# Altium integrated library Res-THP_V2.IntLib: 460 symbols (part 1 of 3) (continued)
## 2R2-1W_KNP100_5%
designator R?, comment value 2R2  Watt: 1W  (hidden comment: KNP100JR-52-2R2)
Resistor Wirewound; Manufacturer: Yageo; Tol: 5%; Part Number: KNP100JR-52-2R2; Package: RES-KNP100; EDM-PN: *; Text2: *; Text1: *
footprint RES-KNP100 (RES 1W PMW 11.5x4.5mm)
pins: 1, 2

## 2R2-1W_KNP100_5%-LARGE
designator R?, comment value 2R2  Watt: 1W  (hidden comment: KNP100JR-52-2R2)
Resistor Wirewound; Manufacturer: Yageo; Tol: 5%; Part Number: KNP100JR-52-2R2; Package: RES-KNP100-LARGE; EDM-PN: *; Text2: *; Text1: *
footprint RES-KNP100-LARGE (RES 1W PMW 11.5x4.5mm)
pins: 1, 2

## 2R2-5W-5%-SQP500
designator R?  value 2R2  Watt: 5W  (hidden comment: 2R2-5W-5%-SQP500)
Resistor Cement; Manufacturer: Yageo; Part Number: SQP500JB-2R2; Tol: 5%; Reutech PN: 5905-WW-0129; Package: RES-SQP500; EDM-PN: *; Text2: *; Text1: *
footprint RES-SQP500 (SQP500  22.0x9.5mm)
pins: 1, 2

## 3K3-0.250W-1%
designator R?, comment value 3K3  Watt: 0.25W  (hidden comment: 3K3-0.250W-1%_H)
Resistor Metal Film; Manufacturer: Various; Part Number: 3K3 1% 0.25W; Tol: 1%; Package: RES-0.250W; EDM-PN: *; Text2: *; Text1: *
footprint RES-0.250W (Res 0.25W 7.6x2.3mm)
pins: 1, 2

## 3K3-0.250W-1%-LARGE
designator R?, comment value 3K3  Watt: 0.25W  (hidden comment: 3K3-0.250W-1%_H)
Resistor Metal Film; Manufacturer: Various; Part Number: 3K3 1% 0.25W; Tol: 1%; Package: RES-0.250W-LARGE; EDM-PN: *; Text2: *; Text1: *
footprint RES-0.250W-LARGE (Res 0.25W 7.6x2.3mm)
pins: 1, 2

## 3K3-0.250W-2%-MOF
designator R?, comment value 3K3  Watt: 0.25W  (hidden comment: 3K3-0.250W-2%)
Resistor Metal Oxide Film; Manufacturer: Various; Part Number: 3K3 2% 0.25W MOF; Tol: 2%; Package: RES-0.250W; EDM-PN: *; Text2: *; Text1: *
footprint RES-0.250W (Res 0.25W 7.6x2.3mm)
pins: 1, 2

## 3K3-0.250W-2%-MOF-500
designator R?, comment value 3K3  Watt: 0.25W  (hidden comment: 3K3-0.250W-2%)
Resistor Metal Oxide Film; Manufacturer: Various; Part Number: 3K3 2% 0.25W MOF; Tol: 2%; Package: RES-0.250W-500; EDM-PN: *; Text2: *; Text1: *
footprint RES-0.250W-500 (Res 0.25W 7.6x2.3mm)
pins: 1, 2

## 3K3-1W-PR01-5%
designator R?  value 3K3  Watt: 1W  (hidden comment: 3K3-1W-PR01-5%)
Resistor Power Metal Film; Manufacturer: Various; Part Number: 3K3 5% 1W; Tol: 5%; Package: RES-PR01; EDM-PN: *; Text2: *; Text1: *
footprint RES-PR01 (RES-PR01 6.5x2.5mm)
pins: 1, 2

## 3K9-0.250W-1%
designator R?, comment value 3K9  Watt: 0.25W  (hidden comment: 3K9-0.250W-1%_H)
Resistor Metal Film; Manufacturer: Various; Part Number: 3K9 1% 0.25W; Tol: 1%; Package: RES-0.250W; EDM-PN: *; Text2: *; Text1: *
footprint RES-0.250W (Res 0.25W 7.6x2.3mm)
pins: 1, 2

## 3K9-0.250W-5%
designator R?, comment value 3K9  Watt: 0.25W  (hidden comment: 3K9-0.250W-5%_H)
Resistor Carbon; Manufacturer: Various; Part Number: 3K9 5% 0.25W; Tol: 5%; Package: RES-0.250W; EDM-PN: *; Text2: *; Text1: *
footprint RES-0.250W (Res 0.25W 7.6x2.3mm)
pins: 1, 2

## 3K-0.250W-1%
designator R?, comment value 3K  Watt: 0.25W  (hidden comment: 3K-0.250W-1%_H)
Resistor Metal Film; Manufacturer: Various; Part Number: 3K 1% 0.25W; Tol: 1%; Package: RES-0.250W; EDM-PN: *; Text2: *; Text1: *
footprint RES-0.250W (Res 0.25W 7.6x2.3mm)
pins: 1, 2

## 3R3-AC05-WW
designator R?  value 3R3  Watt: 5W  (hidden comment: 3R3-AC05-WW)
Resistor Wirewound; Manufacturer: Various; Part Number: 3R3 5% AC05; Tol: 5%; Package: RES-AC05; EDM-PN: *; Text2: *; Text1: *
footprint Res-AC05 (Res AC05 18.0x10.0mm)
pins: 1, 2

## 3R9_1W_KNP100_1%
designator R?, comment value 3R9  Watt: 1W  (hidden comment: 3R9_1W_KNP100_1%_H)
Resistor Wirewound; Manufacturer: Yageo; Part Number: KNP100FB-3R9; Tol: 1%; Package: RES-KNP100; EDM-PN: *; Text2: *; Text1: *
footprint RES-KNP100 (RES 1W PMW 11.5x4.5mm)
pins: 1, 2

## 3R9_1W_KNP100_1%-DNF
designator R?, comment value (3R9)  Watt: 1W  (hidden comment: 3R9_1W_KNP100_1%_H-DNF)
Resistor Wirewound - Do not Fit; Manufacturer: Yageo; Part Number: DNF - KNP100FB-3R9; Tol: 1%; Package: RES-KNP100; EDM-PN: *; Text2: *; Text1: *
footprint RES-KNP100 (RES 1W PMW 11.5x4.5mm)
pins: 1, 2

## 3R9_1W_KNP100_5%
designator R?, comment value 3R9  Watt: 1W  (hidden comment: 3R9_1W_KNP100_5%_H)
Resistor Wirewound; Manufacturer: Yageo; Part Number: KNP100JB-3R9; Tol: 5%; Package: RES-KNP100; EDM-PN: *; Text2: *; Text1: *
footprint RES-KNP100 (RES 1W PMW 11.5x4.5mm)
pins: 1, 2

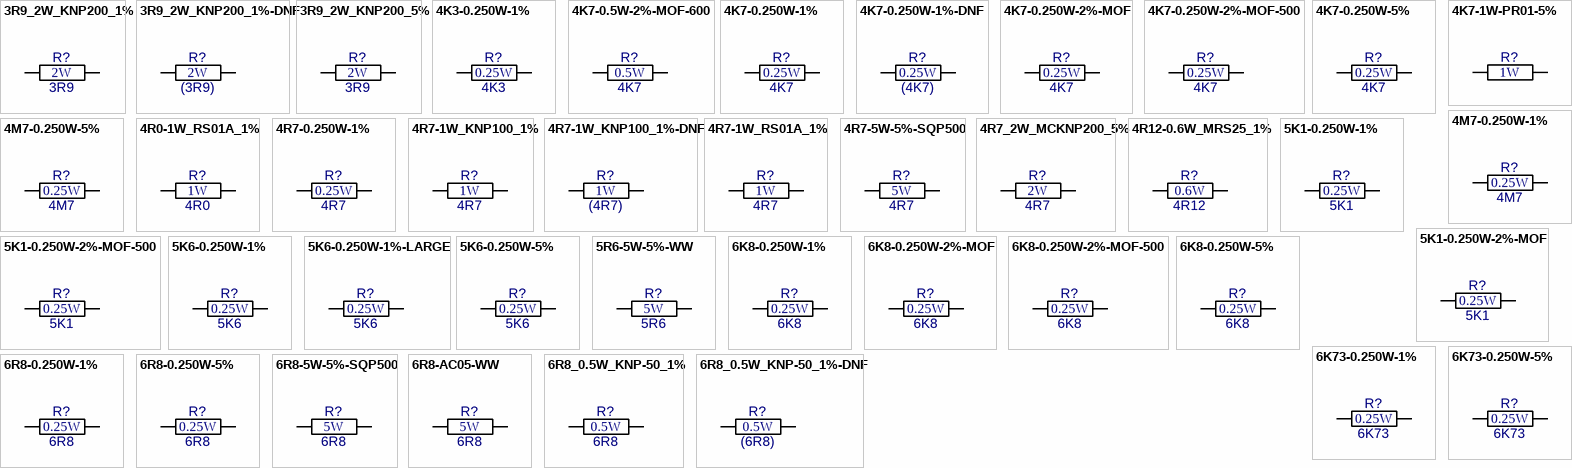
[diagram p3: symbols 3R9_2W_KNP200_1% to 6R8_0.5W_KNP-50_1%-DNF]

## 3R9_2W_KNP200_1%
designator R?, comment value 3R9  Watt: 2W  (hidden comment: 3R9_2W_KNP200_1%_H)
Resistor Wirewound; Manufacturer: Yageo; Part Number: KNP200FB-3R9; Tol: 1%; Package: RES-KNP200; EDM-PN: *; Text2: *; Text1: *
footprint RES-KNP200 (Res KNP200 15.5x5.5mm)
pins: 1, 2

## 3R9_2W_KNP200_1%-DNF
designator R?, comment value (3R9)  Watt: 2W  (hidden comment: 3R9_2W_KNP200_1%_H-DNF)
Resistor Wirewound - Do not Fit; Manufacturer: Yageo; Part Number: DNF - KNP200FB-3R9; Tol: 1%; Package: RES-KNP200; EDM-PN: *; Text2: *; Text1: *
footprint RES-KNP200 (Res KNP200 15.5x5.5mm)
pins: 1, 2

## 3R9_2W_KNP200_5%
designator R?, comment value 3R9  Watt: 2W  (hidden comment: 3R9_2W_KNP200_5%_H)
Resistor Wirewound; Manufacturer: Yageo; Part Number: KNP200JB-3R9; Tol: 5%; Package: RES-KNP200; EDM-PN: *; Text2: *; Text1: *
footprint RES-KNP200 (Res KNP200 15.5x5.5mm)
pins: 1, 2

## 4K3-0.250W-1%
designator R?  value 4K3  Watt: 0.25W  (hidden comment: 4K3-0.250W-1%)
Resistor Metal Film; Manufacturer: Various; Part Number: 4K3 1% 0.25W; Tol: 1%; Package: RES-0.250W; EDM-PN: *; Text2: *; Text1: *
footprint RES-0.250W (Res 0.25W 7.6x2.3mm)
pins: 1, 2

## 4K7-0.5W-2%-MOF-600
designator R?, comment value 4K7  Watt: 0.5W  (hidden comment: 4K7-0.5W-2%)
Resistor Metal Oxide Film; Manufacturer: Various; Part Number: 4K7 2% 0.5W MOF; Tol: 2%; Package: RES-0.5W-600; EDM-PN: *; Text2: *; Text1: *
footprint RES-0.5W-600 (RES-0.5W 10.0x3.8mm)
pins: 1, 2

## 4K7-0.250W-1%
designator R?, comment value 4K7  Watt: 0.25W  (hidden comment: 4K7-0.250W-1%_H)
Resistor Metal Film; Manufacturer: Various; Part Number: 4K7 1% 0.25W; Tol: 1%; Package: RES-0.250W; EDM-PN: *; Text2: *; Text1: *
footprint RES-0.250W (Res 0.25W 7.6x2.3mm)
pins: 1, 2

## 4K7-0.250W-1%-DNF
designator R?, comment value (4K7)  Watt: 0.25W  (hidden comment: 4K7-0.250W-1%_H-DNF)
Resistor Metal Film - Do not Fit; Manufacturer: Various; Part Number: DNF - 4K7 1% 0.25W; Tol: 1%; Package: RES-0.250W; EDM-PN: *; Text2: *; Text1: *
footprint RES-0.250W (Res 0.25W 7.6x2.3mm)
pins: 1, 2

## 4K7-0.250W-2%-MOF
designator R?, comment value 4K7  Watt: 0.25W  (hidden comment: 4K7-0.250W-2%)
Resistor Metal Oxide Film; Manufacturer: Various; Part Number: 4K7 2% 0.25W MOF; Tol: 2%; Package: RES-0.250W; EDM-PN: *; Text2: *; Text1: *
footprint RES-0.250W (Res 0.25W 7.6x2.3mm)
pins: 1, 2

## 4K7-0.250W-2%-MOF-500
designator R?, comment value 4K7  Watt: 0.25W  (hidden comment: 4K7-0.250W-2%)
Resistor Metal Oxide Film; Manufacturer: Various; Part Number: 4K7 2% 0.25W MOF; Tol: 2%; Package: RES-0.250W-500; EDM-PN: *; Text2: *; Text1: *
footprint RES-0.250W-500 (Res 0.25W 7.6x2.3mm)
pins: 1, 2

## 4K7-0.250W-5%
designator R?, comment value 4K7  Watt: 0.25W  (hidden comment: 4K7-0.250W-5%_H)
Resistor Carbon; Manufacturer: Various; Part Number: 4K7 5% 0.25W; Tol: 5%; Package: RES-0.250W; EDM-PN: *; Text2: *; Text1: *
footprint RES-0.250W (Res 0.25W 7.6x2.3mm)
pins: 1, 2

## 4K7-1W-PR01-5%
designator R?  Watt: 1W  (hidden comment: 4K7-1W-PR01-5%)
Resistor Power Metal Film; Manufacturer: Various; Part Number: 4K7 5% 1W; Tol: 5%; Value: 4K7; Package: RES-PR01; EDM-PN: *; Text2: *; Text1: *
footprint RES-PR01 (RES-PR01 6.5x2.5mm)
pins: 1, 2

## 4M7-0.250W-1%
designator R?, comment value 4M7  Watt: 0.25W  (hidden comment: 4M7-0.250W-1%_H)
Resistor Metal Film; Manufacturer: Various; Part Number: 4M7 1% 0.25W; Tol: 1%; Package: RES-0.250W; EDM-PN: *; Text2: *; Text1: *
footprint RES-0.250W (Res 0.25W 7.6x2.3mm)
pins: 1, 2

## 4M7-0.250W-5%
designator R?, comment value 4M7  Watt: 0.25W  (hidden comment: 4M7-0.250W-5%_H)
Resistor Carbon; Manufacturer: Various; Part Number: 4M7 5% 0.25W; Tol: 5%; Package: RES-0.250W; EDM-PN: *; Text2: *; Text1: *
footprint RES-0.250W (Res 0.25W 7.6x2.3mm)
pins: 1, 2

## 4R0-1W_RS01A_1%
designator R?, comment value 4R0  Watt: 1W  (hidden comment: RS01A4R000FE12)
Resistor Wirewound; Manufacturer: Vishay; Tol: 1%; Part Number: RS01A4R000FE12; Package: RES-RS01A; EDM-PN: *; Text2: *; Text1: *
footprint RES-RS01A (RS01A 10.31x2.39mm)
pins: 1, 2

## 4R7-0.250W-1%
designator R?, comment value 4R7  Watt: 0.25W  (hidden comment: 4R7-0.250W-1%_H)
Resistor Metal Film; Manufacturer: Various; Part Number: 4R7 1% 0.25W; Tol: 1%; Package: RES-0.250W; EDM-PN: *; Text2: *; Text1: *
footprint RES-0.250W (Res 0.25W 7.6x2.3mm)
pins: 1, 2

## 4R7-1W_KNP100_1%
designator R?, comment value 4R7  Watt: 1W  (hidden comment: 4R7_1W_KNP100_1%_H)
Resistor Wirewound; Manufacturer: Yageo; Part Number: KNP100FB-4R7; Tol: 1%; Package: RES-KNP100; EDM-PN: *; Text2: *; Text1: *
footprint RES-KNP100 (RES 1W PMW 11.5x4.5mm)
pins: 1, 2

## 4R7-1W_KNP100_1%-DNF
designator R?, comment value (4R7)  Watt: 1W  (hidden comment: 4R7_1W_KNP100_1%_H-DNF)
Resistor Wirewound - Do not Fit; Manufacturer: Yageo; Part Number: DNF - KNP100FB-4R7; Tol: 1%; Package: RES-KNP100; EDM-PN: *; Text2: *; Text1: *
footprint RES-KNP100 (RES 1W PMW 11.5x4.5mm)
pins: 1, 2

## 4R7-1W_RS01A_1%
designator R?, comment value 4R7  Watt: 1W  (hidden comment: RS01A4R700FB12)
Resistor Wirewound; Manufacturer: Vishay; Tol: 1%; Part Number: RS01A4R700FB12; Package: RES-RS01A; EDM-PN: *; Text2: *; Text1: *
footprint RES-RS01A (RS01A 10.31x2.39mm)
pins: 1, 2

## 4R7-5W-5%-SQP500
designator R?  value 4R7  Watt: 5W  (hidden comment: 4R7-5W-5%-SQP500)
Resistor Cement; Manufacturer: Yageo; Part Number: SQP500JB-4R7; Tol: 5%; Package: RES-SQP500; EDM-PN: *; Text2: *; Text1: *
footprint RES-SQP500 (SQP500  22.0x9.5mm)
pins: 1, 2

## 4R7_2W_MCKNP200_5%
designator R?, comment value 4R7  Watt: 2W  (hidden comment: 4R7_2W_MCKNP200_5%_H)
Resistor Wirewound; Manufacturer: Multicomp; Part Number: MCKNP02SJ047JA10; Tol: 2%; Package: RES-MCKNP200; EDM-PN: *; Text2: *; Text1: *
footprint Res-MCKNP200 (Res MCKNP200 16.0x5.5mm)
pins: 1, 2

## 4R12-0.6W_MRS25_1%
designator R?, comment value 4R12  Watt: 0.6W  (hidden comment: MRS25000C4128FCT00)
Resistor Metal Film; Manufacturer: Vishay; Tol: 1%; Part Number: MRS25000C4128FCT00; Package: RES-MRS25; EDM-PN: *; Text2: *; Text1: *
footprint RES-MRS25 (MRS25 6.5x2.5mm)
pins: 1, 2

## 5K1-0.250W-1%
designator R?  value 5K1  Watt: 0.25W  (hidden comment: 5K1-0.250W-1%)
Resistor Metal Film; Manufacturer: Various; Part Number: 5K1 1% 0.25W; Tol: 1%; Package: RES-0.250W; EDM-PN: *; Text2: *; Text1: *
footprint RES-0.250W (Res 0.25W 7.6x2.3mm)
pins: 1, 2

## 5K1-0.250W-2%-MOF
designator R?, comment value 5K1  Watt: 0.25W  (hidden comment: 5K1-0.250W-2%)
Resistor Metal Oxide Film; Manufacturer: Various; Part Number: 5K1 2% 0.25W MOF; Tol: 2%; Package: RES-0.250W; EDM-PN: *; Text2: *; Text1: *
footprint RES-0.250W (Res 0.25W 7.6x2.3mm)
pins: 1, 2

## 5K1-0.250W-2%-MOF-500
designator R?, comment value 5K1  Watt: 0.25W  (hidden comment: 5K1-0.250W-2%)
Resistor Metal Oxide Film; Manufacturer: Various; Part Number: 5K1 2% 0.25W MOF; Tol: 2%; Package: RES-0.250W-500; EDM-PN: *; Text2: *; Text1: *
footprint RES-0.250W-500 (Res 0.25W 7.6x2.3mm)
pins: 1, 2

## 5K6-0.250W-1%
designator R?, comment value 5K6  Watt: 0.25W  (hidden comment: 5K6-0.250W-1%_H)
Resistor Metal Film; Manufacturer: Various; Part Number: 5K6 1% 0.25W; Tol: 1%; Package: RES-0.250W; EDM-PN: *; Text2: *; Text1: *
footprint RES-0.250W (Res 0.25W 7.6x2.3mm)
pins: 1, 2

## 5K6-0.250W-1%-LARGE
designator R?, comment value 5K6  Watt: 0.25W  (hidden comment: 5K6-0.250W-1%_H)
Resistor Metal Film; Manufacturer: Various; Part Number: 5K6 1% 0.25W; Tol: 1%; Package: RES-0.250W-LARGE; EDM-PN: *; Text2: *; Text1: *
footprint RES-0.250W-LARGE (Res 0.25W 7.6x2.3mm)
pins: 1, 2

## 5K6-0.250W-5%
designator R?, comment value 5K6  Watt: 0.25W  (hidden comment: 5K6-0.250W-5%_H)
Resistor Carbon; Manufacturer: Various; Part Number: 5K6 5% 0.25W; Tol: 5%; Package: RES-0.250W; EDM-PN: *; Text2: *; Text1: *
footprint RES-0.250W (Res 0.25W 7.6x2.3mm)
pins: 1, 2

## 5R6-5W-5%-WW
designator R?  value 5R6  Watt: 5W  (hidden comment: 5R6-5W-5%-WW)
Resistor Wirewound; Manufacturer: Various; Part Number: 5R6 5% 5W WW; Tol: 5%; Package: RES-5W-WW; EDM-PN: *; Text2: *; Text1: *
footprint Res-5W-WW (Res 5W WW 17.0x7.5mm)
pins: 1, 2

## 6K8-0.250W-1%
designator R?, comment value 6K8  Watt: 0.25W  (hidden comment: 6K8-0.250W-1%_H)
Resistor Metal Film; Manufacturer: Various; Part Number: 6K8 1% 0.25W; Tol: 1%; Package: RES-0.250W; EDM-PN: *; Text2: *; Text1: *
footprint RES-0.250W (Res 0.25W 7.6x2.3mm)
pins: 1, 2

## 6K8-0.250W-2%-MOF
designator R?, comment value 6K8  Watt: 0.25W  (hidden comment: 6K8-0.250W-2%)
Resistor Metal Oxide Film; Manufacturer: Various; Part Number: 6K8 2% 0.25W MOF; Tol: 2%; Package: RES-0.250W; EDM-PN: *; Text2: *; Text1: *
footprint RES-0.250W (Res 0.25W 7.6x2.3mm)
pins: 1, 2

## 6K8-0.250W-2%-MOF-500
designator R?, comment value 6K8  Watt: 0.25W  (hidden comment: 6K8-0.250W-2%)
Resistor Metal Oxide Film; Manufacturer: Various; Part Number: 6K8 2% 0.25W MOF; Tol: 2%; Package: RES-0.250W-500; EDM-PN: *; Text2: *; Text1: *
footprint RES-0.250W-500 (Res 0.25W 7.6x2.3mm)
pins: 1, 2

## 6K8-0.250W-5%
designator R?, comment value 6K8  Watt: 0.25W  (hidden comment: 6K8-0.250W-5%_H)
Resistor Carbon; Manufacturer: Various; Part Number: 6K8 5% 0.25W; Tol: 5%; Package: RES-0.250W; EDM-PN: *; Text2: *; Text1: *
footprint RES-0.250W (Res 0.25W 7.6x2.3mm)
pins: 1, 2

## 6K73-0.250W-1%
designator R?, comment value 6K73  Watt: 0.25W  (hidden comment: 6K73-0.250W-1%_H)
Resistor Metal Film; Manufacturer: Various; Part Number: 6K73 1% 0.25W; Tol: 1%; Package: RES-0.250W; EDM-PN: *; Text2: *; Text1: *
footprint RES-0.250W (Res 0.25W 7.6x2.3mm)
pins: 1, 2

## 6K73-0.250W-5%
designator R?, comment value 6K73  Watt: 0.25W  (hidden comment: 6K73-0.250W-5%_H)
Resistor Carbon; Manufacturer: Various; Part Number: 6K73 5% 0.25W; Tol: 5%; Package: RES-0.250W; EDM-PN: *; Text2: *; Text1: *
footprint RES-0.250W (Res 0.25W 7.6x2.3mm)
pins: 1, 2

## 6R8-0.250W-1%
designator R?, comment value 6R8  Watt: 0.25W  (hidden comment: 6R8-0.250W-1%_H)
Resistor Metal Film; Manufacturer: Various; Part Number: 6R8 1% 0.25W; Tol: 1%; Package: RES-0.250W; EDM-PN: *; Text2: *; Text1: *
footprint RES-0.250W (Res 0.25W 7.6x2.3mm)
pins: 1, 2

## 6R8-0.250W-5%
designator R?, comment value 6R8  Watt: 0.25W  (hidden comment: 6R8-0.250W-5%_H)
Resistor Carbon; Manufacturer: Various; Part Number: 6R8 5% 0.25W; Tol: 5%; Package: RES-0.250W; EDM-PN: *; Text2: *; Text1: *
footprint RES-0.250W (Res 0.25W 7.6x2.3mm)
pins: 1, 2

## 6R8-5W-5%-SQP500
designator R?  value 6R8  Watt: 5W  (hidden comment: 6R8-5W-5%-SQP500)
Resistor Cement; Manufacturer: Yageo; Part Number: SQP500JB-6R8; Tol: 5%; Package: RES-SQP500; EDM-PN: *; Text2: *; Text1: *
footprint RES-SQP500 (SQP500  22.0x9.5mm)
pins: 1, 2

## 6R8-AC05-WW
designator R?  value 6R8  Watt: 5W  (hidden comment: 6R8-AC05-WW)
Resistor Wirewound; Manufacturer: Various; Part Number: 6R8 5% AC05; Tol: 5%; Package: RES-AC05; EDM-PN: *; Text2: *; Text1: *
footprint Res-AC05 (Res AC05 18.0x10.0mm)
pins: 1, 2

## 6R8_0.5W_KNP-50_1%
designator R?, comment value 6R8  Watt: 0.5W  (hidden comment: 6R8_0.5W_KNP-50_1%_H)
Resistor Wirewound; Manufacturer: Yageo; Part Number: KNP-50FB-6R8; Tol: 1%; Package: RES-KNP-50; EDM-PN: *; Text2: *; Text1: *
footprint RES-KNP-50 (KNP-50 10.0x3.8mm)
pins: 1, 2

## 6R8_0.5W_KNP-50_1%-DNF
designator R?, comment value (6R8)  Watt: 0.5W  (hidden comment: 6R8_0.5W_KNP-50_1%_H-DNF)
Resistor Wirewound - Do not Fit; Manufacturer: Yageo; Part Number: DNF - KNP-50FB-6R8; Tol: 1%; Package: RES-KNP-50; EDM-PN: *; Text2: *; Text1: *
footprint RES-KNP-50 (KNP-50 10.0x3.8mm)
pins: 1, 2

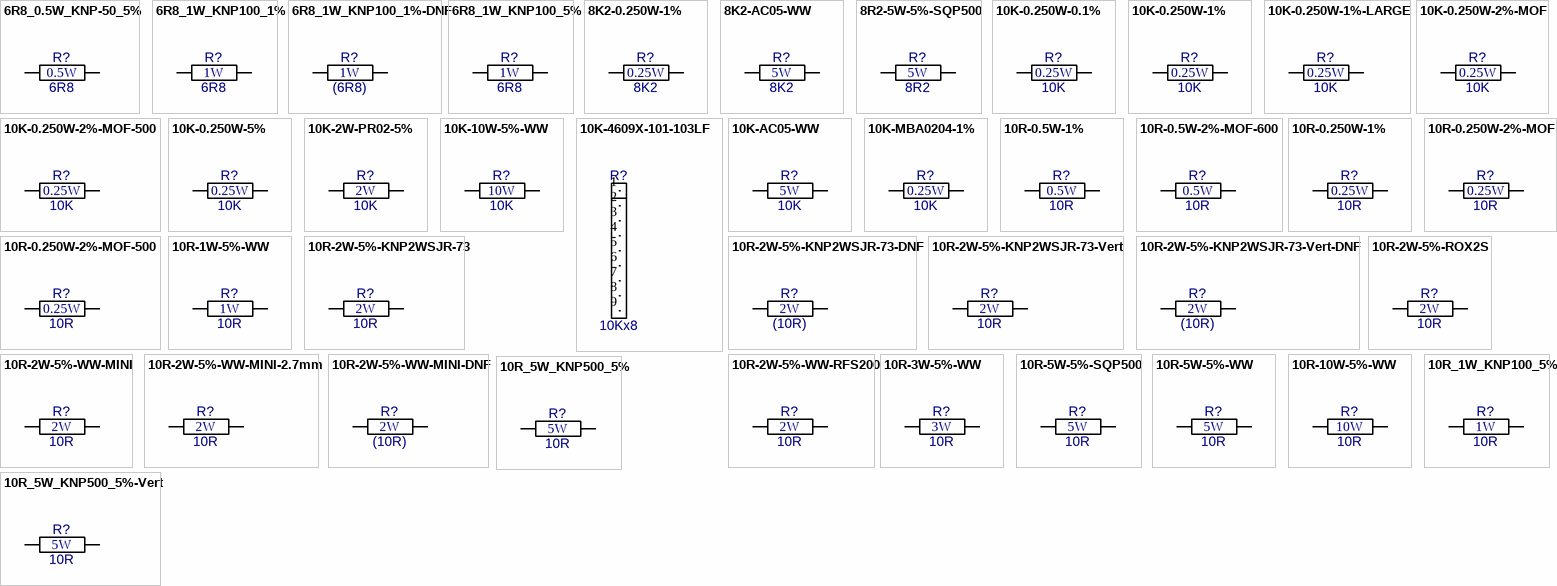
[diagram p4: symbols 6R8_0.5W_KNP-50_5% to 10R_5W_KNP500_5%-Vert]

## 6R8_0.5W_KNP-50_5%
designator R?, comment value 6R8  Watt: 0.5W  (hidden comment: 6R8_0.5W_KNP-50_5%_H)
Resistor Wirewound; Manufacturer: Yageo; Part Number: KNP-50JB-6R8; Tol: 5%; Package: RES-KNP-50; EDM-PN: *; Text2: *; Text1: *
footprint RES-KNP-50 (KNP-50 10.0x3.8mm)
pins: 1, 2

## 6R8_1W_KNP100_1%
designator R?, comment value 6R8  Watt: 1W  (hidden comment: 6R8_1W_KNP100_1%_H)
Resistor Wirewound; Manufacturer: Yageo; Part Number: KNP100FB-6R8; Tol: 1%; Package: RES-KNP100; EDM-PN: *; Text2: *; Text1: *
footprint RES-KNP100 (RES 1W PMW 11.5x4.5mm)
pins: 1, 2

## 6R8_1W_KNP100_1%-DNF
designator R?, comment value (6R8)  Watt: 1W  (hidden comment: 6R8_1W_KNP100_1%_H-DNF)
Resistor Wirewound - Do not Fit; Manufacturer: Yageo; Part Number: DNF - KNP100FB-6R8; Tol: 1%; Package: RES-KNP100; EDM-PN: *; Text2: *; Text1: *
footprint RES-KNP100 (RES 1W PMW 11.5x4.5mm)
pins: 1, 2

## 6R8_1W_KNP100_5%
designator R?, comment value 6R8  Watt: 1W  (hidden comment: 6R8_1W_KNP100_5%_H)
Resistor Wirewound; Manufacturer: Yageo; Part Number: KNP100JB-6R8; Tol: 5%; Package: RES-KNP100; EDM-PN: *; Text2: *; Text1: *
footprint RES-KNP100 (RES 1W PMW 11.5x4.5mm)
pins: 1, 2

## 8K2-0.250W-1%
designator R?, comment value 8K2  Watt: 0.25W  (hidden comment: 8K2-0.250W-1%_H)
Resistor Metal Film; Manufacturer: Various; Part Number: 8K2 1% 0.25W; Tol: 1%; Package: RES-0.250W; EDM-PN: *; Text2: *; Text1: *
footprint RES-0.250W (Res 0.25W 7.6x2.3mm)
pins: 1, 2

## 8K2-AC05-WW
designator R?  value 8K2  Watt: 5W  (hidden comment: 8K2-AC05-WW)
Resistor Wirewound; Manufacturer: Various; Part Number: 8K2 5% AC05; Tol: 5%; Package: RES-AC05; EDM-PN: *; Text2: *; Text1: *
footprint Res-AC05 (Res AC05 18.0x10.0mm)
pins: 1, 2

## 8R2-5W-5%-SQP500
designator R?  value 8R2  Watt: 5W  (hidden comment: 8R2-5W-5%-SQP500)
Resistor Cement; Manufacturer: Yageo; Part Number: SQP500JB-8R2; Tol: 5%; Package: RES-SQP500; EDM-PN: *; Text2: *; Text1: *
footprint RES-SQP500 (SQP500  22.0x9.5mm)
pins: 1, 2

## 10K-0.250W-0.1%
designator R?  value 10K  Watt: 0.25W  (hidden comment: 10K-0.250W-0.1%)
Resistor Metal Film; Manufacturer: Various; Part Number: 10K 1% 0.25W; Tol: 0.1%; Package: RES-0.250W; EDM-PN: *; Text2: *; Text1: *
footprint RES-0.250W (Res 0.25W 7.6x2.3mm)
pins: 1, 2

## 10K-0.250W-1%
designator R?, comment value 10K  Watt: 0.25W  (hidden comment: 10K-0.250W-1%_H)
Resistor Metal Film; Manufacturer: Various; Part Number: 10K 1% 0.25W; Tol: 1%; Package: RES-0.250W; EDM-PN: *; Text2: *; Text1: *
footprint RES-0.250W (Res 0.25W 7.6x2.3mm)
pins: 1, 2

## 10K-0.250W-1%-LARGE
designator R?, comment value 10K  Watt: 0.25W  (hidden comment: 10K-0.250W-1%_H)
Resistor Metal Film; Manufacturer: Various; Part Number: 10K 1% 0.25W; Tol: 1%; Package: RES-0.250W-LARGE; EDM-PN: *; Text2: *; Text1: *
footprint RES-0.250W-LARGE (Res 0.25W 7.6x2.3mm)
pins: 1, 2

## 10K-0.250W-2%-MOF
designator R?, comment value 10K  Watt: 0.25W  (hidden comment: 10K-0.250W-2%)
Resistor Metal Oxide Film; Manufacturer: Various; Part Number: 10K 2% 0.25W MOF; Tol: 2%; Package: RES-0.250W; EDM-PN: *; Text2: *; Text1: *
footprint RES-0.250W (Res 0.25W 7.6x2.3mm)
pins: 1, 2

## 10K-0.250W-2%-MOF-500
designator R?, comment value 10K  Watt: 0.25W  (hidden comment: 10K-0.250W-2%)
Resistor Metal Oxide Film; Manufacturer: Various; Part Number: 10K 2% 0.25W MOF; Tol: 2%; Package: RES-0.250W-500; EDM-PN: *; Text2: *; Text1: *
footprint RES-0.250W-500 (Res 0.25W 7.6x2.3mm)
pins: 1, 2

## 10K-0.250W-5%
designator R?, comment value 10K  Watt: 0.25W  (hidden comment: 10K-0.250W-5%_H)
Resistor Carbon; Manufacturer: Various; Part Number: 10K 5% 0.25W; Tol: 5%; Package: RES-0.250W; EDM-PN: *; Text2: *; Text1: *
footprint RES-0.250W (Res 0.25W 7.6x2.3mm)
pins: 1, 2

## 10K-2W-PR02-5%
designator R?  value 10K  Watt: 2W  (hidden comment: 10K-2W-PR02-5%)
Resistor Power Metal Film; Manufacturer: Various; Part Number: 10K 5% 2W; Tol: 5%; Package: RES-PR02; EDM-PN: *; Text2: *; Text1: *
footprint RES-PR02 (RES 2W PMW 10.0x3.9mm)
pins: 1, 2

## 10K-10W-5%-WW
designator R?  value 10K  Watt: 10W  (hidden comment: 10K-10W-5%-WW)
Resistor Wirewound; Manufacturer: Various; Part Number: 10K 5% 10W WW; Tol: 5%; Package: RES-10W-WW; EDM-PN: *; Text2: *; Text1: *
footprint Res-10W-WW (Res 10W WW 44.0x8.0mm)
pins: 1, 2

## 10K-4609X-101-103LF
designator R?  value 10Kx8  (hidden comment: 10K-4609X-101-103LF)
Resistor Array 8 Res 9Pin; Manufacturer: Bourns; Tol: 1%; Watt: 200mW; Part Number: 4609X-101-103LF; Package: RES-4609X; EDM-PN: *; Text2: *; Text1: *
footprint RES-4609X (Res SIL 9 Pin 20.32x2.5mm)
pins: 1, 2, 3, 4, 5, 6, 7, 8, 9

## 10K-AC05-WW
designator R?  value 10K  Watt: 5W  (hidden comment: 10K-AC05-WW)
Resistor Wirewound; Manufacturer: Various; Part Number: 10K 5% AC05; Tol: 5%; Package: RES-AC05; EDM-PN: *; Text2: *; Text1: *
footprint Res-AC05 (Res AC05 18.0x10.0mm)
pins: 1, 2

## 10K-MBA0204-1%
designator R?, comment value 10K  Watt: 0.25W  (hidden comment: 10K-MBA0204-1%_H)
Resistor Metal Film; Manufacturer: Vishay; Part Number: 10K 1% MBA0204; Tol: 1%; Package: RES-MBA0204; EDM-PN: *; Text2: *; Text1: *; Reutech PN: 5905-94-0103
footprint RES-MBA0204 (MBA0204 3.6x1.6mm)
pins: 1, 2

## 10R-0.5W-1%
designator R?, comment value 10R  Watt: 0.5W  (hidden comment: 10R-0.5W-1%_H)
Resistor Metal Film; Manufacturer: Various; Part Number: 10R 1% 0.5W; Tol: 1%; Package: RES-0.5W; EDM-PN: *; Text2: *; Text1: *
footprint RES-0.5W (RES-0.5W 10.0x3.8mm)
pins: 1, 2

## 10R-0.5W-2%-MOF-600
designator R?, comment value 10R  Watt: 0.5W  (hidden comment: 10R-0.5W-2%)
Resistor Metal Oxide Film; Manufacturer: Various; Part Number: 10R 2% 0.5W MOF; Tol: 2%; Package: RES-0.5W-600; EDM-PN: *; Text2: *; Text1: *
footprint RES-0.5W-600 (RES-0.5W 10.0x3.8mm)
pins: 1, 2

## 10R-0.250W-1%
designator R?, comment value 10R  Watt: 0.25W  (hidden comment: 10R-0.250W-1%_H)
Resistor Metal Film; Manufacturer: Various; Part Number: 10R 1% 0.25W; Tol: 1%; Package: RES-0.250W; EDM-PN: *; Text2: *; Text1: *
footprint RES-0.250W (Res 0.25W 7.6x2.3mm)
pins: 1, 2

## 10R-0.250W-2%-MOF
designator R?, comment value 10R  Watt: 0.25W  (hidden comment: 10R-0.250W-2%)
Resistor Metal Oxide Film; Manufacturer: Various; Part Number: 10R 2% 0.25W MOF; Tol: 2%; Package: RES-0.250W; EDM-PN: *; Text2: *; Text1: *
footprint RES-0.250W (Res 0.25W 7.6x2.3mm)
pins: 1, 2

## 10R-0.250W-2%-MOF-500
designator R?, comment value 10R  Watt: 0.25W  (hidden comment: 10R-0.250W-2%)
Resistor Metal Oxide Film; Manufacturer: Various; Part Number: 10R 2% 0.25W MOF; Tol: 2%; Package: RES-0.250W-500; EDM-PN: *; Text2: *; Text1: *
footprint RES-0.250W-500 (Res 0.25W 7.6x2.3mm)
pins: 1, 2

## 10R-1W-5%-WW
designator R?  value 10R  Watt: 1W  (hidden comment: 10R-1W-5%-WW)
Resistor Wirewound Axial; Manufacturer: Yageo; Part Number: KNP100JR-52-10R; Tol: 5%; Package: RES-KNP100; EDM-PN: *; Text2: *; Text1: *
footprint RES-KNP100 (RES 1W PMW 11.5x4.5mm)
pins: 1, 2

## 10R-2W-5%-KNP2WSJR-73
designator R?, comment value 10R  Watt: 2W  (hidden comment: KNP2WSJR-73-10R)
Resistor Wirewound Miniature Axial; Manufacturer: Yageo; Tol: 5%; Part Number: KNP2WSJR-73-10R; Package: RES-KNP2WS; EDM-PN: *; Text2: *; Text1: *
footprint RES-KNP2WS (RES 2W PMW 11.5x4.5mm)
pins: 1, 2

## 10R-2W-5%-KNP2WSJR-73-DNF
designator R?, comment value (10R)  Watt: 2W  (hidden comment: KNP2WSJR-73-10R)
Resistor Wirewound Miniature Axial - Do not Fit; Manufacturer: Yageo; Part Number: DNF - KNP2WSJR-73-10R; Tol: 5%; Package: RES-KNP2WS; EDM-PN: *; Text2: *; Text1: *
footprint RES-KNP2WS (RES 2W PMW 11.5x4.5mm)
pins: 1, 2

## 10R-2W-5%-KNP2WSJR-73-Vert
designator R?, comment value 10R  Watt: 2W  (hidden comment: KNP2WSJR-73-10R)
Resistor Wirewound Miniature Axial; Manufacturer: Yageo; Tol: 5%; Part Number: KNP2WSJR-73-10R; Package: RES-KNP2WS-Vert; EDM-PN: *; Text2: *; Text1: *
footprint RES-KNP2WS-Vert (RES 2W PMW 4.5x4.5mm)
pins: 1, 2

## 10R-2W-5%-KNP2WSJR-73-Vert-DNF
designator R?, comment value (10R)  Watt: 2W  (hidden comment: KNP2WSJR-73-10R)
Resistor Wirewound Miniature Axial - Do not Fit; Manufacturer: Yageo; Part Number: DNF - KNP2WSJR-73-10R; Tol: 5%; Package: RES-KNP2WS-Vert; EDM-PN: *; Text2: *; Text1: *
footprint RES-KNP2WS-Vert (RES 2W PMW 4.5x4.5mm)
pins: 1, 2

## 10R-2W-5%-ROX2S
designator R?  value 10R  Watt: 2W  (hidden comment: 10R-2W-5%-ROX2S)
Resistor Power Metal Oxide; Manufacturer: Tyco; Part Number: ROX2SJ10R; Tol: 5%; Package: RES-ROX2S; EDM-PN: *; Text2: *; Text1: *
footprint RES-ROX2S (RES ROX2S 12.0x5.0mm)
pins: 1, 2

## 10R-2W-5%-WW-MINI
designator R?  value 10R  Watt: 2W  (hidden comment: 10R-2W-5%-WW-MINI)
Resistor Wirewound Miniature Axial; Manufacturer: Yageo; Part Number: KNP2WSJR-73-10R; Tol: 5%; Package: RES-KNP2WS; EDM-PN: *; Text2: *; Text1: *
footprint RES-KNP2WS (RES 2W PMW 11.5x4.5mm)
pins: 1, 2

## 10R-2W-5%-WW-MINI-2.7mm
designator R?  value 10R  Watt: 2W  (hidden comment: 10R-2W-5%-WW-MINI-2.7mm)
Resistor Wirewound Miniature Axial; Manufacturer: Yageo; Part Number: KNP2WSJR-73-10R; Tol: 5%; Package: RES-KNP2WS-2.7mm; EDM-PN: *; Text2: *; Text1: *
footprint RES-KNP2WS-2.7mm (RES 2W PMW 11.5x4.5mm)
pins: 1, 2

## 10R-2W-5%-WW-MINI-DNF
designator R?, comment value (10R)  Watt: 2W  (hidden comment: 10R-2W-5%-WW-MINI)
Resistor Wirewound Miniature Axial - Do not Fit; Manufacturer: Yageo; Part Number: DNF - KNP2WSJR-73-10R; Tol: 5%; Package: RES-KNP2WS; EDM-PN: *; Text2: *; Text1: *
footprint RES-KNP2WS (RES 2W PMW 11.5x4.5mm)
pins: 1, 2

## 10R-2W-5%-WW-RFS200
designator R?  value 10R  Watt: 2W  (hidden comment: 10R-2W-5%-WW-RFS200)
Resistor Wirewound Axial; Manufacturer: Yageo; Part Number: RSF200JB-73-10R; Tol: 5%; Package: RES-RFS200; EDM-PN: *; Text2: *; Text1: *
footprint Res-RSF200 (Res RSF200 15.5x5.5mm)
pins: 1, 2

## 10R-3W-5%-WW
designator R?  value 10R  Watt: 3W  (hidden comment: 10R-3W-5%-WW)
Resistor Wirewound; Manufacturer: Various; Part Number: 10R 5% 3W WW; Tol: 5%; Package: RES-3W-WW; EDM-PN: *; Text2: *; Text1: *
footprint Res-3W-WW (Res 3W WW 13.0x5.5mm)
pins: 1, 2

## 10R-5W-5%-SQP500
designator R?  value 10R  Watt: 5W  (hidden comment: 10R-5W-5%-SQP500)
Resistor Cement; Manufacturer: Yageo; Part Number: SQP500JB-10R; Tol: 5%; Package: RES-SQP500; EDM-PN: *; Text2: *; Text1: *
footprint RES-SQP500 (SQP500  22.0x9.5mm)
pins: 1, 2

## 10R-5W-5%-WW
designator R?  value 10R  Watt: 5W  (hidden comment: 10R-5W-5%-WW)
Resistor Wirewound; Manufacturer: Various; Part Number: 10R 5% 5W WW; Tol: 5%; Package: RES-5W-WW; EDM-PN: *; Text2: *; Text1: *
footprint Res-5W-WW (Res 5W WW 17.0x7.5mm)
pins: 1, 2

## 10R-10W-5%-WW
designator R?  value 10R  Watt: 10W  (hidden comment: 10R-10W-5%-WW)
Resistor Wirewound; Manufacturer: Various; Part Number: 10R 5% 10W WW; Tol: 5%; Package: RES-10W-WW; EDM-PN: *; Text2: *; Text1: *
footprint Res-10W-WW (Res 10W WW 44.0x8.0mm)
pins: 1, 2

## 10R_1W_KNP100_5%
designator R?, comment value 10R  Watt: 1W  (hidden comment: 10R_1W_KNP100_5%_H)
Resistor Wirewound; Manufacturer: Yageo; Part Number: KNP100JR-52-10R; Tol: 5%; Reutech PN: 5905-WW-0134; Package: RES-KNP100; EDM-PN: *; Text2: *; Text1: *
footprint RES-KNP100 (RES 1W PMW 11.5x4.5mm)
pins: 1, 2

## 10R_5W_KNP500_5%
designator R?, comment value 10R  Watt: 5W  (hidden comment: 10R_5W_KNP500_5%_H)
Resistor Wirewound; Manufacturer: Yageo; Part Number: KNP500JB-10R; Tol: 5%; Package: RES-KNP500; EDM-PN: *; Text2: *; Text1: *; Reutech PN: *
footprint Res-KNP500 (Res KNP500 24.5x8.5mm)
pins: 1, 2

## 10R_5W_KNP500_5%-Vert
designator R?, comment value 10R  Watt: 5W  (hidden comment: 10R_5W_KNP500_5%_H-Vert)
Resistor Wirewound; Manufacturer: Yageo; Part Number: KNP500JB-10R; Tol: 5%; Package: Res-KNP500-VERT; EDM-PN: *; Text2: *; Text1: *; Reutech PN: *
footprint Res-KNP500-VERT (Res KNP500 24.5x8.5mm)
pins: 1, 2

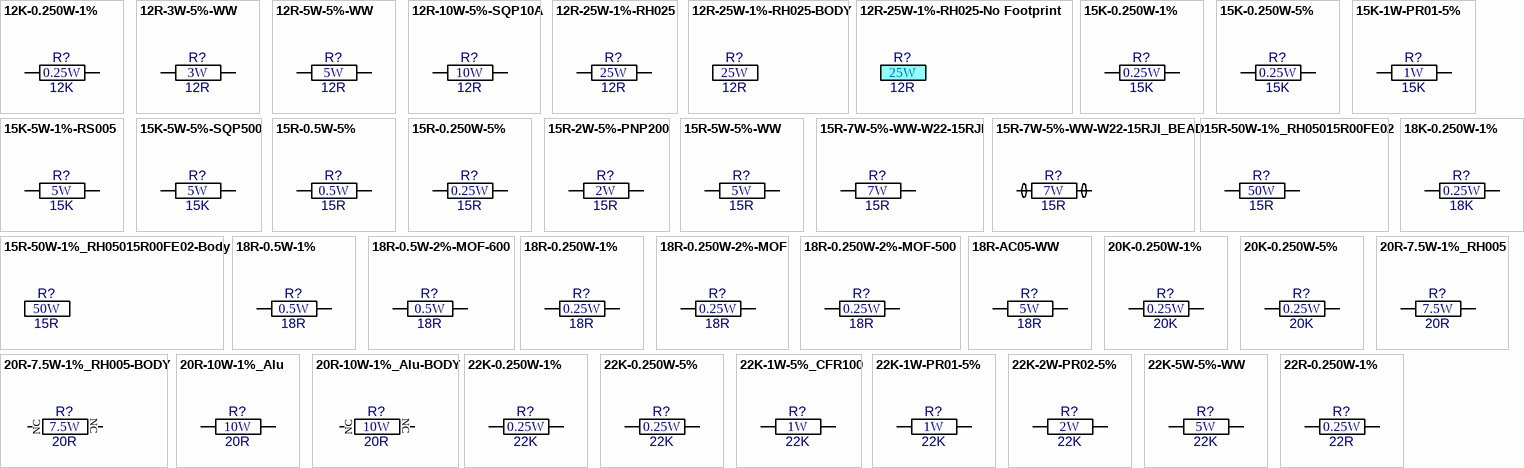
[diagram p5: symbols 12K-0.250W-1% to 22R-0.250W-1%]

## 12K-0.250W-1%
designator R?, comment value 12K  Watt: 0.25W  (hidden comment: 12K-0.250W-1%_H)
Resistor Metal Film; Manufacturer: Various; Part Number: 12K 1% 0.25W; Tol: 1%; Package: RES-0.250W; EDM-PN: *; Text2: *; Text1: *
footprint RES-0.250W (Res 0.25W 7.6x2.3mm)
pins: 1, 2

## 12R-3W-5%-WW
designator R?  value 12R  Watt: 3W  (hidden comment: 12R-3W-5%-WW)
Resistor Wirewound; Manufacturer: Various; Part Number: 12R 5% 3W WW; Tol: 5%; Package: RES-3W-WW; EDM-PN: *; Text2: *; Text1: *
footprint Res-3W-WW (Res 3W WW 13.0x5.5mm)
pins: 1, 2

## 12R-5W-5%-WW
designator R?  value 12R  Watt: 5W  (hidden comment: 12R-5W-5%-WW)
Resistor Wirewound; Manufacturer: Various; Part Number: 12R 5% 5W WW; Tol: 5%; Package: RES-5W-WW; EDM-PN: *; Text2: *; Text1: *
footprint Res-5W-WW (Res 5W WW 17.0x7.5mm)
pins: 1, 2

## 12R-10W-5%-SQP10A
designator R?  value 12R  Watt: 10W  (hidden comment: 12R-10W-5%-SQP10A)
Resistor Cement; Manufacturer: Yageo; Part Number: SQP10AJB-12R; Tol: 5%; Reutech PN: 5905-WW-0128; Package: RES-SQP10A; EDM-PN: *; Text2: *; Text1: *
footprint RES-SQP10A (SQP10A  48.0x9.5mm)
pins: 1, 2

## 12R-25W-1%-RH025
designator R?  value 12R  Watt: 25W  (hidden comment: 12R-25W-1%-RH025)
Resistor Wirewound  Aluminum Chassis Mount; Manufacturer: Vishay; Part Number: RH02512R00FE02; Tol: 1%; Package: RES-RH025 25Watt; EDM-PN: *; Text2: *; Text1: *
footprint RES-RH025 25Watt (RH025 25Watt 26.97x13.97mm)
pins: 1, 2

## 12R-25W-1%-RH025-BODY
designator R?, comment value 12R  Watt: 25W  (hidden comment: 12R-25W-1%-RH025)
Resistor Wirewound  Aluminum Chassis Mount; Manufacturer: Vishay; Part Number: RH02512R00FE02; Tol: 1%; Package: RES-RH025 Body; EDM-PN: *; Text2: *; Text1: *
footprint RES-RH025 Body (RH025 25Watt 26.97x13.97mm)

## 12R-25W-1%-RH025-No Footprint
designator R?, comment value 12R  Watt: 25W  (hidden comment: 12R-25W-1%-RH025)
Resistor Wirewound  Aluminum Chassis Mount; Manufacturer: Vishay; Part Number: RH02512R00FE02; Tol: 1%; Package: N/A; EDM-PN: *; Text2: *; Text1: *

## 15K-0.250W-1%
designator R?, comment value 15K  Watt: 0.25W  (hidden comment: 15K-0.250W-1%_H)
Resistor Carbon; Manufacturer: Various; Part Number: 15K 1% 0.25W; Tol: 1%; Package: RES-0.250W; EDM-PN: *; Text2: *; Text1: *
footprint RES-0.250W (Res 0.25W 7.6x2.3mm)
pins: 1, 2

## 15K-0.250W-5%
designator R?, comment value 15K  Watt: 0.25W  (hidden comment: 15K-0.250W-5%_H)
Resistor Carbon; Manufacturer: Various; Part Number: 15K 5% 0.25W; Tol: 5%; Package: RES-0.250W; EDM-PN: *; Text2: *; Text1: *
footprint RES-0.250W (Res 0.25W 7.6x2.3mm)
pins: 1, 2

## 15K-1W-PR01-5%
designator R?  value 15K  Watt: 1W  (hidden comment: 15K-1W-PR01-5%)
Resistor Power Metal Film; Manufacturer: Various; Part Number: 15K 5% 1W; Tol: 5%; Package: RES-PR01; EDM-PN: *; Text2: *; Text1: *
footprint RES-PR01 (RES-PR01 6.5x2.5mm)
pins: 1, 2